# Altium schematic symbol library IC_ADI.SCHLIB: 3169 symbols (part 58 of 181)
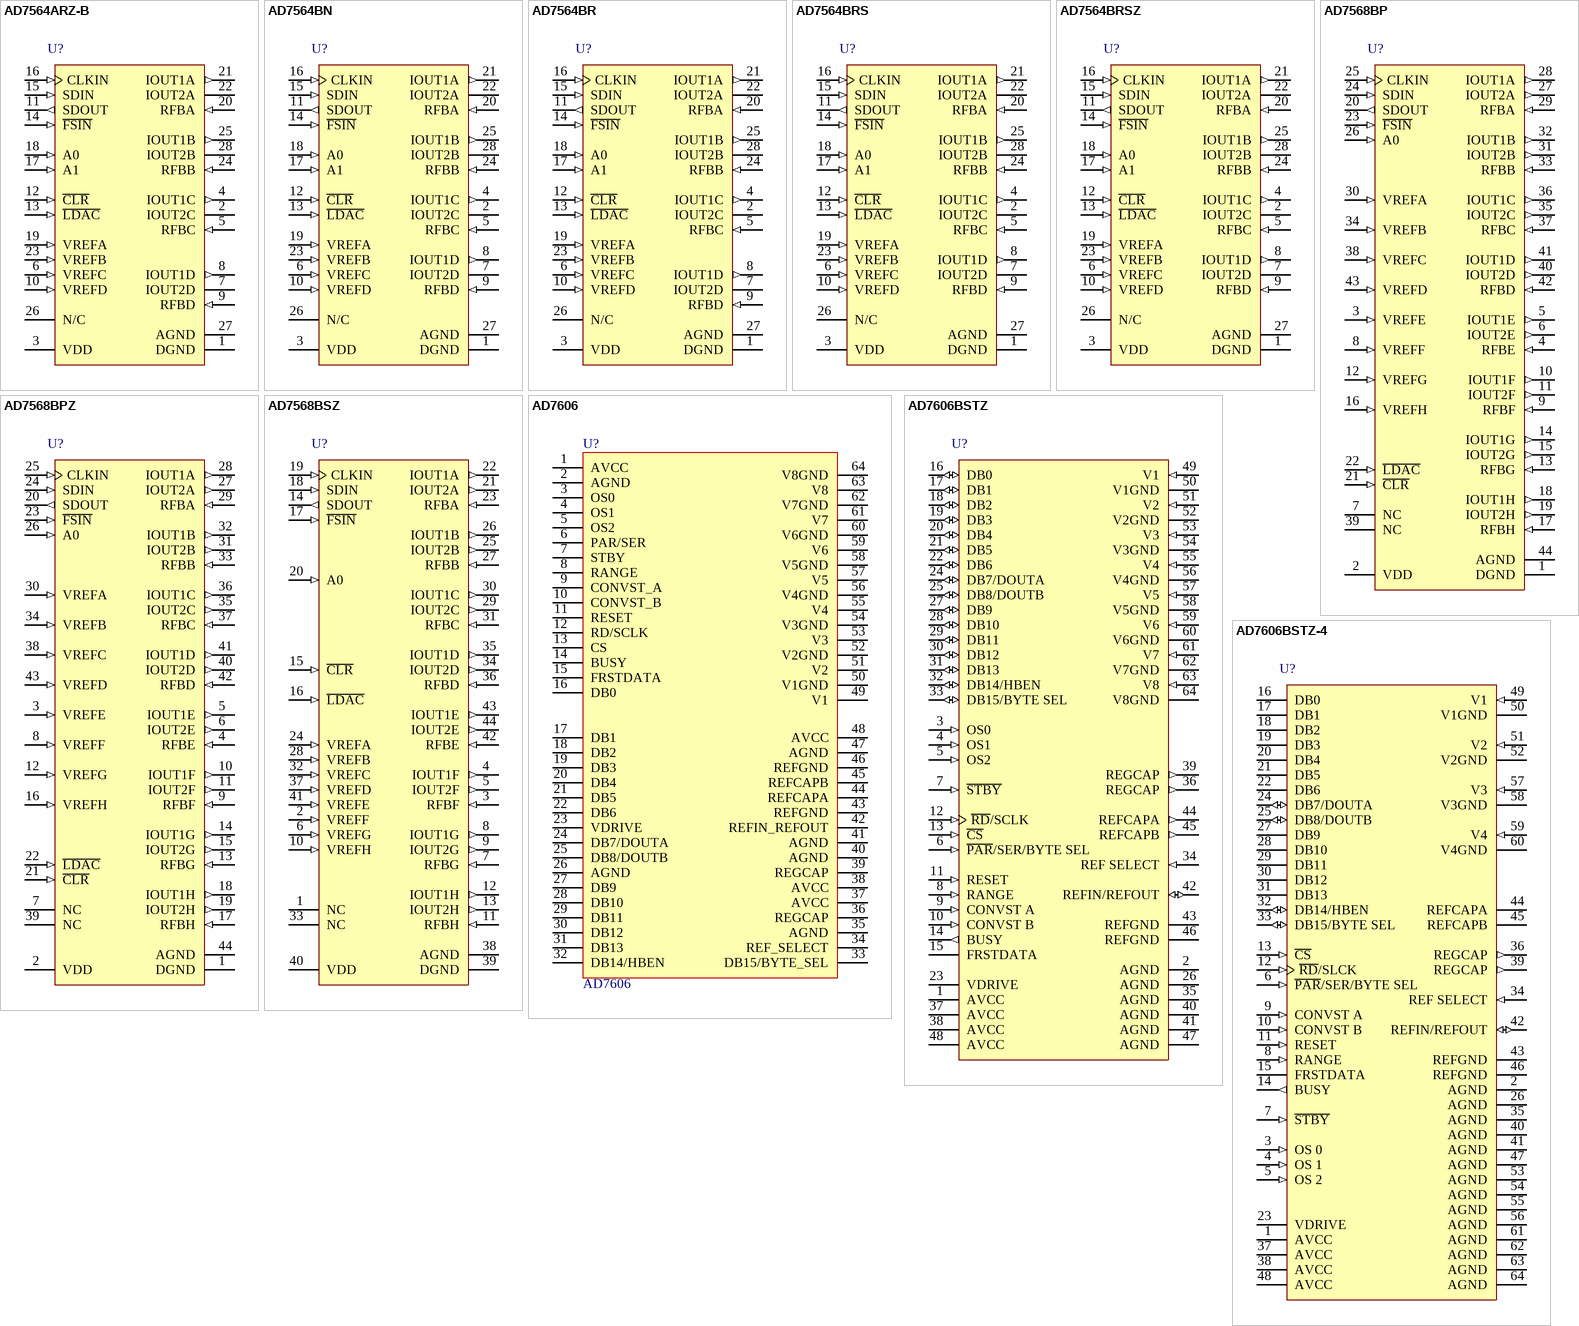
[diagram p248: symbols AD7564ARZ-B to AD7606BSTZ-4]

## AD7568BP
designator U?
Octal 12-Bit LC2MOS Digital-to-Analog Converter, -40 to +85 degC, P-44A, Tube; Generic Part Number: AD7568; PartNumber: AD7568BP; # DAC Outputs: 8; Max V+: 5.25V; Op Pwr Diss: 17.5mW; Resolution (Bits): 12; Settling Time: 500ns; Single Supply: Yes; DatasheetVersion: Rev.C; PackageVersion: 2003; PackageReference: P-44A; PackageDescription: 44-Lead Plastic Leaded Chip Carrier [PLCC]; Supplier Part Number 1: AD7568BP-ND; Supplier Part Number 2: 584-AD7568BP; Packing: Tube; RoHS: N; Mounting Technology: Surface Mount; Code_JEDEC: MO-047-AC; Code_IPC: PLCC-44; ComponentLink1Description: Manufacturer URL; ComponentLink2Description: Datasheet; ComponentLink3Description: Package Specification; ComponentLink4Description: Product URL
footprint PLCC-44N (Footprint not found)
pins: 1 DGND (power) "Digital Ground.", 2 VDD (power) "Positive Power Supply. This is 5 V +/- 5%.", 3 VREFE (in) "DAC Reference Input.", 4 RFBE (in) "DAC Feedback Resistor Pin.", 5 IOUT1E (out) "DAC Current Output Terminal.", 6 IOUT2E (out) "DAC Current Output Terminal.", 7 NC "No Connect.", 8 VREFF (in) "DAC Reference Input.", 9 RFBF (in) "DAC Feedback Resistor Pin.", 10 IOUT1F (out) "DAC Current Output Terminal.", 11 IOUT2F (out) "DAC Current Output Terminal.", 12 VREFG (in) "DAC Reference Input.", 13 RFBG (in) "DAC Feedback Resistor Pin.", 14 IOUT1G (out) "DAC Current Output Terminal.", 15 IOUT2G (out) "DAC Current Output Terminal.", 16 VREFH (in) "DAC Reference Input.", 17 RFBH (in) "DAC Feedback Resistor Pin.", 18 IOUT1H (out) "DAC Current Output Terminal.", 19 IOUT2H (out) "DAC Current Output Terminal.", 20 SDOUT (out) "This shift register output allows multiple devices to be connected in a daisy-chain configuration.", 21 ~{CLR} (in) "Asynchronous C\L\R\ Input. When this input is taken low, all DAC latch outputs go to zero.", 22 ~{LDAC} (in) "Asynchronous L\D\A\C\ Input. When this input is taken low, all DAC latches are simultaneously updated with the contents of the input latches.", 23 ~{FSIN} (in) "Level-Triggered Control Input (Active Low). This is the frame synchronization signal for the input data. When F\S\I\N\ goes low, it enables the input shift register, and data is transferred on the falling edges of CLKIN. If (See Datasheet)", 24 SDIN (in) "Serial Data Input. The device accepts a 16-bit word. The first bit (DB15) is the DAC MSB, with the remaining bits following. Next comes the device address bit, A0. If this does not correspond to the logic level on Pin A0, (See Datasheet)", 25 CLKIN (in) "Clock Input. Data is clocked into the input shift register on the falling edges of CLKIN. Add a pull-down resistor on the clock line to avoid timing issues.", 26 A0 (in) "Device Address Pin. This input gives the device an address. If DB3 of the serial input stream does not correspond to this, the data that follows is ignored and not loaded to any input latch. However, it will appear at SDOUT (See Datasheet)", 27 IOUT2A (out) "DAC Current Output Terminal.", 28 IOUT1A (out) "DAC Current Output Terminal.", 29 RFBA (in) "DAC Feedback Resistor Pin.", 30 VREFA (in) "DAC Reference Input.", 31 IOUT2B (out) "DAC Current Output Terminal.", 32 IOUT1B (out) "DAC Current Output Terminal.", 33 RFBB (in) "DAC Feedback Resistor Pin.", 34 VREFB (in) "DAC Reference Input.", 35 IOUT2C (out) "DAC Current Output Terminal.", 36 IOUT1C (out) "DAC Current Output Terminal.", 37 RFBC (in) "DAC Feedback Resistor Pin.", 38 VREFC (in) "DAC Reference Input.", 39 NC "No Connect.", 40 IOUT2D (out) "DAC Current Output Terminal.", 41 IOUT1D (out) "DAC Current Output Terminal.", 42 RFBD (in) "DAC Feedback Resistor Pin.", 43 VREFD (in) "DAC Reference Input.", 44 AGND (power) "Analog Ground."

## AD7568BPZ
designator U?
Octal 12-Bit LC2MOS Digital-to-Analog Converter, -40 to +85 degC, P-44A, Pb-Free, Tube; Generic Part Number: AD7568; PartNumber: AD7568BPZ; # DAC Outputs: 8; Max V+: 5.25V; Op Pwr Diss: 17.5mW; Resolution (Bits): 12; Settling Time: 500ns; Single Supply: Yes; DatasheetVersion: Rev.C; PackageVersion: 2003; PackageReference: P-44A; PackageDescription: 44-Lead Plastic Leaded Chip Carrier [PLCC]; Supplier Part Number 1: AD7568BPZ-ND; Supplier Part Number 2: 59K5054; Supplier Part Number 3: 584-AD7568BPZ; Packing: Tube; RoHS: Y; Mounting Technology: Surface Mount; Code_JEDEC: MO-047-AC; Code_IPC: PLCC-44; ComponentLink1Description: Manufacturer URL; ComponentLink2Description: Datasheet; ComponentLink3Description: Package Specification; ComponentLink4Description: Product URL
footprint PLCC-44N (Footprint not found)
pins: 1 DGND (power) "Digital Ground.", 2 VDD (power) "Positive Power Supply. This is 5 V +/- 5%.", 3 VREFE (in) "DAC Reference Input.", 4 RFBE (in) "DAC Feedback Resistor Pin.", 5 IOUT1E (out) "DAC Current Output Terminal.", 6 IOUT2E (out) "DAC Current Output Terminal.", 7 NC "No Connect.", 8 VREFF (in) "DAC Reference Input.", 9 RFBF (in) "DAC Feedback Resistor Pin.", 10 IOUT1F (out) "DAC Current Output Terminal.", 11 IOUT2F (out) "DAC Current Output Terminal.", 12 VREFG (in) "DAC Reference Input.", 13 RFBG (in) "DAC Feedback Resistor Pin.", 14 IOUT1G (out) "DAC Current Output Terminal.", 15 IOUT2G (out) "DAC Current Output Terminal.", 16 VREFH (in) "DAC Reference Input.", 17 RFBH (in) "DAC Feedback Resistor Pin.", 18 IOUT1H (out) "DAC Current Output Terminal.", 19 IOUT2H (out) "DAC Current Output Terminal.", 20 SDOUT (out) "This shift register output allows multiple devices to be connected in a daisy-chain configuration.", 21 ~{CLR} (in) "Asynchronous C\L\R\ Input. When this input is taken low, all DAC latch outputs go to zero.", 22 ~{LDAC} (in) "Asynchronous L\D\A\C\ Input. When this input is taken low, all DAC latches are simultaneously updated with the contents of the input latches.", 23 ~{FSIN} (in) "Level-Triggered Control Input (Active Low). This is the frame synchronization signal for the input data. When F\S\I\N\ goes low, it enables the input shift register, and data is transferred on the falling edges of CLKIN. If (See Datasheet)", 24 SDIN (in) "Serial Data Input. The device accepts a 16-bit word. The first bit (DB15) is the DAC MSB, with the remaining bits following. Next comes the device address bit, A0. If this does not correspond to the logic level on Pin A0, (See Datasheet)", 25 CLKIN (in) "Clock Input. Data is clocked into the input shift register on the falling edges of CLKIN. Add a pull-down resistor on the clock line to avoid timing issues.", 26 A0 (in) "Device Address Pin. This input gives the device an address. If DB3 of the serial input stream does not correspond to this, the data that follows is ignored and not loaded to any input latch. However, it will appear at SDOUT (See Datasheet)", 27 IOUT2A (out) "DAC Current Output Terminal.", 28 IOUT1A (out) "DAC Current Output Terminal.", 29 RFBA (in) "DAC Feedback Resistor Pin.", 30 VREFA (in) "DAC Reference Input.", 31 IOUT2B (out) "DAC Current Output Terminal.", 32 IOUT1B (out) "DAC Current Output Terminal.", 33 RFBB (in) "DAC Feedback Resistor Pin.", 34 VREFB (in) "DAC Reference Input.", 35 IOUT2C (out) "DAC Current Output Terminal.", 36 IOUT1C (out) "DAC Current Output Terminal.", 37 RFBC (in) "DAC Feedback Resistor Pin.", 38 VREFC (in) "DAC Reference Input.", 39 NC "No Connect.", 40 IOUT2D (out) "DAC Current Output Terminal.", 41 IOUT1D (out) "DAC Current Output Terminal.", 42 RFBD (in) "DAC Feedback Resistor Pin.", 43 VREFD (in) "DAC Reference Input.", 44 AGND (power) "Analog Ground."

## AD7568BSZ
designator U?
Octal 12-Bit LC2MOS Digital-to-Analog Converter, 0 to +70 degC, S-44-2, Pb-Free, Tray; Generic Part Number: AD7568; PartNumber: AD7568BSZ; # DAC Outputs: 8; Max V+: 5.25V; Op Pwr Diss: 17.5mW; Resolution (Bits): 12; Settling Time: 500ns; Single Supply: Yes; DatasheetVersion: Rev.C; PackageVersion: 041807-A; PackageReference: S-44-2; PackageDescription: 44-Lead Metric Quad Flat Package [MQFP]; Supplier Part Number 1: AD7568BSZ-ND; Supplier Part Number 2: 1311330; Supplier Part Number 3: 59K5056; Supplier Part Number 4: 584-AD7568BSZ; Packing: Tray; RoHS: Y; Mounting Technology: Surface Mount; Code_JEDEC: MO-122-AA-1; ComponentLink1Description: Manufacturer URL; ComponentLink2Description: Datasheet; ComponentLink3Description: Package Specification; ComponentLink4Description: Product URL
footprint LQFP44_0.8mm (Footprint not found)
pins: 1 NC "No connection", 2 VREFF (in) "DAC Reference Input", 3 RFBF (in) "DAC Feedback Resistor Pin", 4 IOUT1F (out) "DAC Current Output Terminal", 5 IOUT2F (out) "DAC Current Output Terminal", 6 VREFG (in) "DAC Reference Input", 7 RFBG (in) "DAC Feedback Resistor Pin", 8 IOUT1G (out) "DAC Current Output Terminal", 9 IOUT2G (out) "DAC Current Output Terminal", 10 VREFH (in) "DAC Reference Input", 11 RFBH (in) "DAC Feedback Resistor Pin", 12 IOUT1H (out) "DAC Current Output Terminal", 13 IOUT2H (out) "DAC Current Output Terminal", 14 SDOUT (out) "This shift register output allows multiple devices to be connected in a daisy-chain configuration.", 15 ~{CLR} (in) "Asynchronous C\L\R\ Input. When this input is taken low, all DAC latch outputs go to zero.", 16 ~{LDAC} (in) "Asynchronous L\D\A\C\ Input. When this input is taken low, all DAC latches are simultaneously updated with the contents of the input latches.", 17 ~{FSIN} (in) "Level-Triggered Control Input (Active Low). This is the frame synchronization signal for the input data. When F\S\I\N\ goes low, it enables the input shift register, and data is transferred on the falling edges of CLKIN. If (See Datasheet)", 18 SDIN (in) "Serial Data Input. The device accepts a 16-bit word. The first bit (DB15) is the DAC MSB, with the remaining bits following. Next comes the device address bit, A0. If this does not correspond to the logic level on Pin A0, (See Datasheet)", 19 CLKIN (in) "Clock Input. Data is clocked into the input shift register on the falling edges of CLKIN. Add a pull-down resistor on the clock line to avoid timing issues.", 20 A0 (in) "Device Address Pin. This input gives the device an address. If DB3 of the serial input stream does not correspond to this, the data that follows is ignored and not loaded to any input latch. However, it will appear at SDOUT (See Datasheet)", 21 IOUT2A (out) "DAC Current Output Terminal", 22 IOUT1A (out) "DAC Current Output Terminal", 23 RFBA (in) "DAC Feedback Resistor Pin", 24 VREFA (in) "DAC Reference Input", 25 IOUT2B (out) "DAC Current Output Terminal", 26 IOUT1B (out) "DAC Current Output Terminal", 27 RFBB (in) "DAC Feedback Resistor Pin", 28 VREFB (in) "DAC Reference Input", 29 IOUT2C (out) "DAC Current Output Terminal", 30 IOUT1C (out) "DAC Current Output Terminal", 31 RFBC (in) "DAC Feedback Resistor Pin", 32 VREFC (in) "DAC Reference Input", 33 NC "No connection", 34 IOUT2D (out) "DAC Current Output Terminal", 35 IOUT1D (out) "DAC Current Output Terminal", 36 RFBD (in) "DAC Feedback Resistor Pin", 37 VREFD (in) "DAC Reference Input", 38 AGND (power) "This pin connects to the back gates of the current steering switches. It should be connected to the signal ground of the system.", 39 DGND (power) "Digital Ground.", 40 VDD (power) "Positive Power Supply. This is 5 V +/- 5%.", 41 VREFE (in) "DAC Reference Input", 42 RFBE (in) "DAC Feedback Resistor Pin", 43 IOUT1E (out) "DAC Current Output Terminal", 44 IOUT2E (out) "DAC Current Output Terminal"

## AD7606
designator U?
footprint LQFP64_0.5MM
pins: 1 AVCC, 2 AGND, 3 OS0, 4 OS1, 5 OS2, 6 PAR/SER, 7 STBY, 8 RANGE, 9 CONVST_A, 10 CONVST_B, 11 RESET, 12 RD/SCLK, 13 CS, 14 BUSY, 15 FRSTDATA, 16 DB0, 17 DB1, 18 DB2, 19 DB3, 20 DB4, 21 DB5, 22 DB6, 23 VDRIVE, 24 DB7/DOUTA, 25 DB8/DOUTB, 26 AGND, 27 DB9, 28 DB10, 29 DB11, 30 DB12, 31 DB13, 32 DB14/HBEN, 33 DB15/BYTE_SEL, 34 REF_SELECT, 35 AGND, 36 REGCAP, 37 AVCC, 38 AVCC, 39 REGCAP, 40 AGND, 41 AGND, 42 REFIN_REFOUT, 43 REFGND, 44 REFCAPA, 45 REFCAPB, 46 REFGND, 47 AGND, 48 AVCC, 49 V1, 50 V1GND, 51 V2, 52 V2GND, 53 V3, 54 V3GND, 55 V4, 56 V4GND, 57 V5, 58 V5GND, 59 V6, 60 V6GND, 61 V7, 62 V7GND, 63 V8, 64 V8GND

## AD7606BSTZ
designator U?
8 Channel Data Acquisition System with 16-Bit, Bipolar Input, Simultaneous Sampling Analog-to-Digital Converter with Parallel, Serial and SPI Interface, 200KSPS, -40 to +85 degC, ST-64-2, Pb-Free, Tray; Generic Part Number: AD7606; PartNumber: AD7606BSTZ; Resolution (Bits): 16; Channels: 8; Throughput Rate (SPS): 200K; Interface: Par, Ser, SPI; DatasheetVersion: Rev.C; PackageVersion: 051706-A; PackageReference: ST-64-2; PackageDescription: 64-Lead Low Profile Quad Flat Package [LQFP]; Supplier Part Number 1: AD7606BSTZ-ND; Supplier Part Number 2: 1864685; Supplier Part Number 3: 76R7614; Supplier Part Number 4: 584-AD7606BSTZ; RoHS: Y; Packing: Tray; Mounting Technology: Surface Mount; Code_JEDEC: MS-026-BCD; ComponentLink1Description: Manufacturer URL; ComponentLink2Description: Datasheet; ComponentLink3Description: Package Specification; ComponentLink4Description: Product URL
footprint LQFP64_0.5MM (Footprint not found)
pins: 1 AVCC (power) "Analog Supply Voltage, 4.75 V to 5.25 V. This supply voltage is applied to the internal front-end amplifiers and to the ADC core. These supply pins should be decoupled to AGND.", 2 AGND (power) "Analog Ground. These pins are the ground reference points for all analog circuitry on the AD7606. All analog input signals and external reference signals should be referred to these pins. All six of these AGND pins should (See Datasheet)", 3 OS0 (in) "Oversampling Mode Pins. Logic inputs. These inputs are used to select the oversampling ratio. OS 2 is the MSB control bit, and OS 0 is the LSB control bit. See the Digital Filter section for more details about the (See Datasheet)", 4 OS1 (in) "Oversampling Mode Pins. Logic inputs. These inputs are used to select the oversampling ratio. OS 2 is the MSB control bit, and OS 0 is the LSB control bit. See the Digital Filter section for more details about the (See Datasheet)", 5 OS2 (in) "Oversampling Mode Pins. Logic inputs. These inputs are used to select the oversampling ratio. OS 2 is the MSB control bit, and OS 0 is the LSB control bit. See the Digital Filter section for more details about the (See Datasheet)", 6 ~{PAR}/SER/BYTE SEL (in) "Parallel/Serial/Byte Interface Selection Input. Logic input. If this pin is tied to a logic low, the parallel interface is selected. If this pin is tied to a logic high,the serial interface is selected. Parallel byte (See Datasheet)", 7 ~{STBY} (in) "Standby Mode Input. This pin is used to place the AD7606/AD7606-6/AD7606-4 into one of two power-down modes: standby mode or shutdown mode. The power-down mode entered depends on the state of the RANGE pin, as shown in Table (See Datasheet)", 8 RANGE (in) "Analog Input Range Selection. Logic input. The polarity on this pin deter-mines the input range of the analog input channels. If this pin is tied to a logic high, the analog input range is +/-10 V for all channels. If this (See Datasheet)", 9 CONVST A (in) "Conversion Start Input A. Logic inputs. These logic inputs are used to initiate conversions on the analog input channels. For simultaneous sampling of all input channels, CONVST A and CONVST B can be shorted together, and a (See Datasheet)", 10 CONVST B (in) "Conversion Start Input B. Logic inputs. These logic inputs are used to initiate conversions on the analog input channels. For simultaneous sampling of all input channels, CONVST A and CONVST B can be shorted together, and a (See Datasheet)", 11 RESET (in) "Reset Input. When set to logic high, the rising edge of RESET resets the AD7606/AD7606-6/AD7606-4. The part should receive a RESET pulse after power-up. The RESET high pulse should typically be 50 ns wide. If a RESET pulse (See Datasheet)", 12 ~{RD}/SCLK (in) "Parallel Data Read Control Input When the Parallel Interface Is Selected (R\D\)/ Serial Clock Input When the Serial Interface Is Selected (SCLK). When both C\S\ and R\D\ are logic low in parallel mode, the output bus is (See Datasheet)", 13 ~{CS} (in) "Chip Select. This active low logic input frames the data transfer. When both C\S\ and R\D\ are logic low in parallel mode, the DB[15:0] output bus is enabled and the conversion result is output on the parallel data bus lines.(See Datasheet)", 14 BUSY (out) "Busy Output. This pin transitions to a logic high after both CONVST A and CONVST B rising edges and indicates that the conversion process has started. The BUSY output remains high until the conversion process for all (See Datasheet)", 15 FRSTDATA (hiz) "Digital Output. The FRSTDATA output signal indicates when the first channel, V1, is being read back on the parallel, byte, or serial interface. When the C\S\ input is high, the FRSTDATA output pin is in three-state. The (See Datasheet)", 16 DB0 (io) "Parallel Output Data Bit, DB6 to DB0. When P\A\R\/SER/BYTE SEL = 0, this pin acts as three-state parallel digital input/output pin. When C\S\ and R\D\ are low, these pins are used to output DB6 to DB0 of the conversion (See Datasheet)", 17 DB1 (io) "Parallel Output Data Bit, DB6 to DB0. When P\A\R\/SER/BYTE SEL = 0, this pin acts as three-state parallel digital input/output pin. When C\S\ and R\D\ are low, these pins are used to output DB6 to DB0 of the conversion (See Datasheet)", 18 DB2 (io) "Parallel Output Data Bit, DB6 to DB0. When P\A\R\/SER/BYTE SEL = 0, this pin acts as three-state parallel digital input/output pin. When C\S\ and R\D\ are low, these pins are used to output DB6 to DB0 of the conversion (See Datasheet)", 19 DB3 (io) "Parallel Output Data Bit, DB6 to DB0. When P\A\R\/SER/BYTE SEL = 0, this pin acts as three-state parallel digital input/output pin. When C\S\ and R\D\ are low, these pins are used to output DB6 to DB0 of the conversion (See Datasheet)", 20 DB4 (io) "Parallel Output Data Bit, DB6 to DB0. When P\A\R\/SER/BYTE SEL = 0, this pin acts as three-state parallel digital input/output pin. When C\S\ and R\D\ are low, these pins are used to output DB6 to DB0 of the conversion (See Datasheet)", 21 DB5 (io) "Parallel Output Data Bit, DB6 to DB0. When P\A\R\/SER/BYTE SEL = 0, this pin acts as three-state parallel digital input/output pin. When C\S\ and R\D\ are low, these pins are used to output DB6 to DB0 of the conversion (See Datasheet)", 22 DB6 (io) "Parallel Output Data Bit, DB6 to DB0. When P\A\R\/SER/BYTE SEL = 0, this pin acts as three-state parallel digital input/output pin. When C\S\ and R\D\ are low, these pins are used to output DB6 to DB0 of the conversion (See Datasheet)", 23 VDRIVE (power) "Logic Power Supply Input. The voltage (2.3 V to 5.25 V) supplied at this pin determines the operating voltage of the interface. This pin is nominally at the same supply as the supply of the host interface (that is, DSP and (See Datasheet)", 24 DB7/DOUTA (io) "Parallel Output Data Bit 7 (DB7)/Serial Interface Data Output Pin (DoutA). When P\A\R\/SER/BYTE SEL = 0, this pin acts as a three-state parallel digital input/output pin. When C\S\ and R\D\ are low, this pin is used to (See Datasheet)", 25 DB8/DOUTB (io) "Parallel Output Data Bit 8 (DB8)/Serial Interface Data Output Pin (DoutB).  When P\A\R\/SER/BYTE SEL = 0, this pin acts as a three-state parallel digital input/output pin. When C\S\ and R\D\ are low, this pin is used to (See Datasheet)", 26 AGND (power) "Analog Ground. These pins are the ground reference points for all analog circuitry on the AD7606. All analog input signals and external reference signals should be referred to these pins. All six of these AGND pins should (See Datasheet)", 27 DB9 (io) "Parallel Output Data Bit, DB13 to DB9. When P\A\R\/SER/BYTE SEL = 0, this pin acts as three-state parallel digital input/output pin. When C\S\ and R\D\ are low, these pins are used to output DB13 to DB9 of the conversion (See Datasheet)", 28 DB10 (io) "Parallel Output Data Bit, DB13 to DB9. When P\A\R\/SER/BYTE SEL = 0, this pin acts as three-state parallel digital input/output pin. When C\S\ and R\D\ are low, these pins are used to output DB13 to DB9 of the conversion (See Datasheet)", 29 DB11 (io) "Parallel Output Data Bit, DB13 to DB9. When P\A\R\/SER/BYTE SEL = 0, this pin acts as three-state parallel digital input/output pin. When C\S\ and R\D\ are low, these pins are used to output DB13 to DB9 of the conversion (See Datasheet)", 30 DB12 (io) "Parallel Output Data Bit, DB13 to DB9. When P\A\R\/SER/BYTE SEL = 0, this pin acts as three-state parallel digital input/output pin. When C\S\ and R\D\ are low, these pins are used to output DB13 to DB9 of the conversion (See Datasheet)", 31 DB13 (io) "Parallel Output Data Bit, DB13 to DB9. When P\A\R\/SER/BYTE SEL = 0, this pin acts as three-state parallel digital input/output pin. When C\S\ and R\D\ are low, these pins are used to output DB13 to DB9 of the conversion (See Datasheet)", 32 DB14/HBEN (io) "Parallel Output Data Bit 14 (DB14)/High Byte Enable (HBEN). When P\A\R\/ SER/BYTE SEL = 0, this pin acts as a three-state parallel digital output pin. When C\S\ and R\D\ are low, this pin is used to output DB14 of the (See Datasheet)", 33 DB15/BYTE SEL (io) "Parallel Output Data Bit 15 (DB15)/Parallel Byte Mode Select (BYTE SEL).  When P\A\R\/SER/BYTE SEL = 0, this pin acts as a three-state parallel digital output pin. When C\S\ and R\D\ are low, this pin is used to output DB15 (See Datasheet)", 34 REF SELECT (in) "Internal/External Reference Selection Input. Logic input. If this pin is set to logic high, the internal reference is selected and enabled. If this pin is set to logic low, the internal reference is disabled and an external (See Datasheet)", 35 AGND (power) "Analog Ground. These pins are the ground reference points for all analog circuitry on the AD7606. All analog input signals and external reference signals should be referred to these pins. All six of these AGND pins should (See Datasheet)", 36 REGCAP (out) "Decoupling Capacitor Pin for Voltage Output from Internal Regulator.  These output pins should be decoupled separately to AGND using a 1 uF capacitor. The voltage on these pins is in the range of 2.5 V to 2.7 V.", 37 AVCC (power) "Analog Supply Voltage, 4.75 V to 5.25 V. This supply voltage is applied to the internal front-end amplifiers and to the ADC core. These supply pins should be decoupled to AGND.", 38 AVCC (power) "Analog Supply Voltage, 4.75 V to 5.25 V. This supply voltage is applied to the internal front-end amplifiers and to the ADC core. These supply pins should be decoupled to AGND.", 39 REGCAP (out) "Decoupling Capacitor Pin for Voltage Output from Internal Regulator.  These output pins should be decoupled separately to AGND using a 1 uF capacitor. The voltage on these pins is in the range of 2.5 V to 2.7 V.", 40 AGND (power) "Analog Ground. These pins are the ground reference points for all analog circuitry on the AD7606. All analog input signals and external reference signals should be referred to these pins. All six of these AGND pins should (See Datasheet)", 41 AGND (power) "Analog Ground. These pins are the ground reference points for all analog circuitry on the AD7606. All analog input signals and external reference signals should be referred to these pins. All six of these AGND pins should (See Datasheet)", 42 REFIN/REFOUT (io) "Reference Input (REFIN)/Reference Output (REFOUT). The on-chip reference of 2.5 V is available on this pin for external use if the REF SELECT pin is set to logic high. Alternatively, the internal reference can be disabled by (See Datasheet)", 43 REFGND (power) "Reference Ground Pins. These pins should be connected to AGND.", 44 REFCAPA (out) "Reference Buffer Output Force/Sense Pins. These pins must be connected together and decoupled to AGND using a low ESR, 10 uF ceramic capacitor. The voltage on these pins is typically 4.5 V.", 45 REFCAPB (out) "Reference Buffer Output Force/Sense Pins. These pins must be connected together and decoupled to AGND using a low ESR, 10 uF ceramic capacitor. The voltage on these pins is typically 4.5 V.", 46 REFGND (power) "Reference Ground Pins. These pins should be connected to AGND.", 47 AGND (power) "Analog Ground. These pins are the ground reference points for all analog circuitry on the AD7606. All analog input signals and external reference signals should be referred to these pins. All six of these AGND pins should (See Datasheet)", 48 AVCC (power) "Analog Supply Voltage, 4.75 V to 5.25 V. This supply voltage is applied to the internal front-end amplifiers and to the ADC core. These supply pins should be decoupled to AGND.", 49 V1 (in) "Analog Input. This pin is a single-ended analog input. The analog input range of this channel is determined by the RANGE pin.", 50 V1GND (power) "Analog Input Ground Pins. These pins correspond to Analog Input Pin V1 and Analog Input Pin V2. All analog input AGND pins should connect to the AGND plane of a system.", 51 V2 (in) "Analog Input. This pin is a single-ended analog input. The analog input range of this channel is determined by the RANGE pin.", 52 V2GND (power) "Analog Input Ground Pins. These pins correspond to Analog Input Pin V1 and Analog Input Pin V2. All analog input AGND pins should connect to the AGND plane of a system.", 53 V3 (in) "Analog Input 3. For the AD7606-4, this is an AGND pin.", 54 V3GND (power) "Analog Input Ground Pin. For the AD7606-4, this is an AGND pin.", 55 V4 (in) "Analog Input 4. For the AD7606-6 and the AD7606-4, this is an AGND pin.", 56 V4GND (power) "Analog Input Ground Pin. For the AD7606-6 and AD7606-4, this is an AGND pin.", 57 V5 (in) "Analog Inputs. These pins are single-ended analog inputs. The analog input range of these channels is determined by the RANGE pin.", 58 V5GND (power) "Analog Input Ground Pins. All analog input AGND pins should connect to the AGND plane of a system.", 59 V6 (in) "Analog Inputs. These pins are single-ended analog inputs.", 60 V6GND (power) "Analog Input Ground Pins. All analog input AGND pins should connect to the AGND plane of a system.", 61 V7 (in) "Analog Input Pins. For the AD7606-4, this is an AGND pin.", 62 V7GND (power) "Analog Input Ground Pins. For the AD7606-4, this is an AGND pin.", 63 V8 (in) "Analog Input Pin. For the AD7606-4 and AD7606-6, this is an AGND pin.", 64 V8GND (power) "Analog Input Ground Pin. For the AD7606-4 and AD7606-6, this is an AGND pin."

## AD7606BSTZ-4
designator U?
Quad Data Acquisition System with 16-Bit, Bipolar Input, Simultaneous Sampling Analog-to-Digital Converter with Parallel, Serial and SPI Interface, 200KSPS, -40 to +85 degC, ST-64-2, Pb-Free, Tray; Generic Part Number: AD7606-4; PartNumber: AD7606BSTZ-4; Resolution (Bits): 16; Channels: 4; Throughput Rate (SPS): 200K; Interface: Par, Ser, SPI; DatasheetVersion: Rev.C; PackageVersion: 051706-A; PackageReference: ST-64-2; PackageDescription: 64-Lead Low Profile Quad Flat Package [LQFP]; Supplier Part Number 1: AD7606BSTZ-4-ND; Supplier Part Number 2: 2295975; Supplier Part Number 3: 76R7616; Supplier Part Number 4: 584-AD7606BSTZ-4; RoHS: Y; Packing: Tray; Mounting Technology: Surface Mount; Code_JEDEC: MS-026-BCD; ComponentLink1Description: Manufacturer URL; ComponentLink2Description: Datasheet; ComponentLink3Description: Package Specification; ComponentLink4Description: Product URL
footprint LQFP64_0.5MM (Footprint not found)
pins: 1 AVCC (power) "Analog Supply Voltage, 4.75 V to 5.25 V. This supply voltage is applied to the internal front-end amplifiers and to the ADC core. These supply pins should be decoupled to AGND.", 2 AGND (power) "Analog Ground. These pins are the ground reference points for all analog circuitry on the AD7606. All analog input signals and external reference signals should be referred to these pins. All six of these AGND pins should (See Datasheet)", 3 OS 0 (in) "Oversampling Mode Pins. Logic inputs. These inputs are used to select the oversampling ratio. OS 2 is the MSB control bit, and OS 0 is the LSB control bit. See the Digital Filter section for more details about the (See Datasheet)", 4 OS 1 (in) "Oversampling Mode Pins. Logic inputs. These inputs are used to select the oversampling ratio. OS 2 is the MSB control bit, and OS 0 is the LSB control bit. See the Digital Filter section for more details about the (See Datasheet)", 5 OS 2 (in) "Oversampling Mode Pins. Logic inputs. These inputs are used to select the oversampling ratio. OS 2 is the MSB control bit, and OS 0 is the LSB control bit. See the Digital Filter section for more details about the (See Datasheet)", 6 ~{PAR}/SER/BYTE SEL (in) "Parallel/Serial/Byte Interface Selection Input. Logic input. If this pin is tied to a logic low, the parallel interface is selected. If this pin is tied to a logic high, the serial interface is selected. Parallel byte (See Datasheet)", 7 ~{STBY} (in) "Standby Mode Input. This pin is used to place the AD7606/AD7606-6/ AD7606-4 into one of two power-down modes: standby mode or shutdown mode. The power-down mode entered depends on the state of the RANGE pin, as shown in (See Datasheet)", 8 RANGE (in) "Analog Input Range Selection. Logic input. The polarity on this pin deter-mines the input range of the analog input channels. If this pin is tied to a logic high, the analog input range is +/-10 V for all channels. If this (See Datasheet)", 9 CONVST A (in) "Conversion Start Input A. Logic inputs. These logic inputs are used to initiate conversions on the analog input channels.For simultaneous sampling of all input channels, CONVST A and CONVST B can be shorted together, and a (See Datasheet)", 10 CONVST B (in) "Conversion Start Input B. Logic inputs. These logic inputs are used to initiate conversions on the analog input channels.For simultaneous sampling of all input channels, CONVST A and CONVST B can be shorted together, and a (See Datasheet)", 11 RESET (in) "Reset Input. When set to logic high, the rising edge of RESET resets the AD7606/AD7606-6/AD7606-4. The part should receive a RESET pulse after power-up. The RESET high pulse should typically be 50 ns wide. If a RESET pulse (See Datasheet)", 12 ~{RD}/SLCK (in) "Parallel Data Read Control Input When the Parallel Interface Is Selected (R\D\)/ Serial Clock Input When the Serial Interface Is Selected (SCLK). When both C\S\ and R\D\ are logic low in parallel mode, the output bus is (See Datasheet)", 13 ~{CS} (in) "Chip Select. This active low logic input frames the data transfer. When both C\S\ and R\D\ are logic low in parallel mode, the DB[15:0] output bus is enabled and the conversion result is output on the parallel data bus lines.(See Datasheet)", 14 BUSY (out) "Busy Output. This pin transitions to a logic high after both CONVST A and CONVST B rising edges and indicates that the conversion process has started. The BUSY output remains high until the conversion process for all (See Datasheet)", 15 FRSTDATA (hiz) "Digital Output. The FRSTDATA output signal indicates when the first channel, V1, is being read back on the parallel, byte, or serial interface. When the C\S\ input is high, the FRSTDATA output pin is in three-state. The (See Datasheet)", 16 DB0 (hiz) "Parallel Output Data Bits DB0. When P\A\R\/SER/BYTE SEL = 0, this pin acts as three-state parallel digital input/output pin. When C\S\ and R\D\ are low, this pin is used to output  DB0 of the conversion result. When (See Datasheet)", 17 DB1 (hiz) "Parallel Output Data Bits DB1. When P\A\R\/SER/BYTE SEL = 0, this pin acts as three-state parallel digital input/output pin. When C\S\ and R\D\ are low, this pin is used to output  DB1 of the conversion result. When (See Datasheet)", 18 DB2 (hiz) "Parallel Output Data Bits DB2. When P\A\R\/SER/BYTE SEL = 0, this pin acts as three-state parallel digital input/output pin. When C\S\ and R\D\ are low, this pin is used to output  DB2 of the conversion result. When (See Datasheet)", 19 DB3 (hiz) "Parallel Output Data Bits DB3. When P\A\R\/SER/BYTE SEL = 0, this pin acts as three-state parallel digital input/output pin. When C\S\ and R\D\ are low, this pin is used to output  DB3 of the conversion result. When (See Datasheet)", 20 DB4 (hiz) "Parallel Output Data Bits DB4. When P\A\R\/SER/BYTE SEL = 0, this pin acts as three-state parallel digital input/output pin. When C\S\ and R\D\ are low, this pin is used to output  DB4 of the conversion result. When (See Datasheet)", 21 DB5 (hiz) "Parallel Output Data Bits DB5. When P\A\R\/SER/BYTE SEL = 0, this pin acts as three-state parallel digital input/output pin. When C\S\ and R\D\ are low, this pin is used to output  DB5 of the conversion result. When (See Datasheet)", 22 DB6 (hiz) "Parallel Output Data Bits DB6. When P\A\R\/SER/BYTE SEL = 0, this pin acts as three-state parallel digital input/output pin. When C\S\ and R\D\ are low, this pin is used to output  DB6 of the conversion result. When (See Datasheet)", 23 VDRIVE (power) "Logic Power Supply Input. The voltage (2.3 V to 5.25 V) supplied at this pin determines the operating voltage of the interface. This pin is nominally at the same supply as the supply of the host interface (that is, DSP and (See Datasheet)", 24 DB7/DOUTA (io) "Parallel Output Data Bit 7 (DB7)/Serial Interface Data Output Pin (DOUTA). When P\A\R\/SER/BYTE SEL = 0, this pins acts as a three-state parallel digital input/output pin. When C\S\ and R\D\ are low, this pin is used to (See Datasheet)", 25 DB8/DOUTB (io) "Parallel Output Data Bit 8 (DB8)/Serial Interface Data Output Pin (DOUTB).When P\A\R\/SER/BYTE SEL = 0, this pin acts as a three-state parallel digital input/output pin. When C\S\ and R\D\ are low, this pin is used to output (See Datasheet)", 26 AGND (power) "Analog Ground. These pins are the ground reference points for all analog circuitry on the AD7606. All analog input signals and external reference signals should be referred to these pins. All six of these AGND pins should (See Datasheet)", 27 DB9 (hiz) "Parallel Output Data DB9. When P\A\R\/SER/BYTE SEL = 0, this pin acts as three-state parallel digital input/output pin. When C\S\ and R\D\ are low, this pin is used to output DB9 of the conversion result. When (See Datasheet)", 28 DB10 (hiz) "Parallel Output Data DB10. When P\A\R\/SER/BYTE SEL = 0, this pin acts as three-state parallel digital input/output pin. When C\S\ and R\D\ are low, this pin is used to output DB10 of the conversion result. When (See Datasheet)", 29 DB11 (hiz) "Parallel Output Data DB11. When P\A\R\/SER/BYTE SEL = 0, this pin acts as three-state parallel digital input/output pin. When C\S\ and R\D\ are low, this pin is used to output DB11 of the conversion result. When (See Datasheet)", 30 DB12 (hiz) "Parallel Output Data DB12. When P\A\R\/SER/BYTE SEL = 0, this pin acts as three-state parallel digital input/output pin. When C\S\ and R\D\ are low, this pin is used to output DB12 of the conversion result. When (See Datasheet)", 31 DB13 (hiz) "Parallel Output Data DB13. When P\A\R\/SER/BYTE SEL = 0, this pin acts as three-state parallel digital input/output pin. When C\S\ and R\D\ are low, this pin is used to output DB13 of the conversion result. When (See Datasheet)", 32 DB14/HBEN (io) "Parallel Output Data Bit 14 (DB14)/High Byte Enable (HBEN). When P\A\R\/ SER/BYTE SEL = 0, this pin acts as a three-state parallel digital output pin. When C\S\ and R\D\ are low, this pin is used to output DB14 of the (See Datasheet)", 33 DB15/BYTE SEL (io) "Parallel Output Data Bit 15 (DB15)/Parallel Byte Mode Select (BYTE SEL). When P\A\R\/SER/BYTE SEL = 0, this pin acts as a three-state parallel digital output pin. When C\S\ and R\D\ are low, this pin is used to output DB15 (See Datasheet)", 34 REF SELECT (in) "Internal/External Reference Selection Input. Logic input. If this pin is set to logic high, the internal reference is selected and enabled. If this pin is set to logic low, the internal reference is disabled and an external (See Datasheet)", 35 AGND (power) "Analog Ground. These pins are the ground reference points for all analog circuitry on the AD7606. All analog input signals and external reference signals should be referred to these pins. All six of these AGND pins should (See Datasheet)", 36 REGCAP (out) "Decoupling Capacitor Pin for Voltage Output from Internal Regulator.These output pins should be decoupled separately to AGND using a 1 uF capacitor. The voltage on these pins is in the range of 2.5 V to 2.7 V.", 37 AVCC (power) "Analog Supply Voltage, 4.75 V to 5.25 V. This supply voltage is applied to the internal front-end amplifiers and to the ADC core. These supply pins should be decoupled to AGND.", 38 AVCC (power) "Analog Supply Voltage, 4.75 V to 5.25 V. This supply voltage is applied to the internal front-end amplifiers and to the ADC core. These supply pins should be decoupled to AGND.", 39 REGCAP (out) "Decoupling Capacitor Pin for Voltage Output from internal Regulator. These output pins should be decoupled separately to AGND using a 1 uF capacitor. The voltage on these pins is in the range of 2.5V to 2.7 V.", 40 AGND (power) "Analog Ground. These pins are the ground reference points for all analog circuitry on the AD7606. All analog input signals and external reference signals should be referred to these pins. All six of these AGND pins should (See Datasheet)", 41 AGND (power) "Analog Ground. These pins are the ground reference points for all analog circuitry on the AD7606. All analog input signals and external reference signals should be referred to these pins. All six of these AGND pins should (See Datasheet)", 42 REFIN/REFOUT (io) "Reference Input (REFIN)/Reference Output (REFOUT). The on-chip reference of 2.5 V is available on this pin for external use if the REF SELECT pin is set to logic high. Alternatively, the internal reference can be disabled by (See Datasheet)", 43 REFGND (power) "Reference Ground Pins. These pins should be connected to AGND.", 44 REFCAPA "Reference Buffer Output Force/Sense Pins. These pins must be connected together and decoupled to AGND using a low ESR, 10 uF ceramic capacitor. The voltage on these pins is typically 4.5 V.", 45 REFCAPB "Reference Buffer Output Force/Sense Pins. These pins must be connected together and decoupled to AGND using a low ESR, 10 uF ceramic capacitor. The voltage on these pins is typically 4.5 V.", 46 REFGND (power) "Reference Ground Pins. These pins should be connected to AGND.", 47 AGND (power) "Analog Ground. These pins are the ground reference points for all analog circuitry on the AD7606. All analog input signals and external reference signals should be referred to these pins. All six of these AGND pins should (See Datasheet)", 48 AVCC (power) "Analog Supply Voltage, 4.75 V to 5.25 V. This supply voltage is applied to the internal front-end amplifiers and to the ADC core. These supply pins should be decoupled to AGND.", 49 V1 (in) "Analog Input. This pin is a single-ended analog input. The analog input range of this channel is determined by the RANGE pin.", 50 V1GND (power) "Analog Input Ground Pins. These pins correspond to Analog Input Pin V1 and Analog Input Pin V2. All analog input AGND pins should connect to the AGND plane of a system.", 51 V2 (in) "Analog Input. This pin is a single-ended analog input. The analog input range of this channel is determined by the RANGE pin.", 52 V2GND (power) "Analog Input Ground Pins. These pins correspond to Analog Input Pin V1 and Analog Input Pin V2. All analog input AGND pins should connect to the AGND plane of a system.", 53 AGND (power) "Analog Input 3. For the AD7606-4, this is an AGND pin.", 54 AGND (power) "Analog Input Ground Pin. For the AD7606-4, this is an AGND pin.", 55 AGND (power) "Analog Input 4. For  the AD7606-4, this is an AGND pin.", 56 AGND (power) "Analog Input Ground Pin. For the  AD7606-4, this is an AGND pin.", 57 V3 (in) "Analog Inputs. These pins are single-ended analog inputs. The analog input range of these channels is determined by the RANGE pin.", 58 V3GND (power) "Analog Input Ground Pins. All analog input AGND pins should connect to the AGND plane of a system.", 59 V4 (in) "Analog Inputs. These pins are single-ended analog inputs.", 60 V4GND (power) "Analog Input Ground Pins. All analog input AGND pins should connect to the AGND plane of a system.", 61 AGND (power) "Analog Input Pins. For the AD7606-4, this is an AGND pin.", 62 AGND (power) "Analog Input Ground Pins. For the AD7606-4, this is an AGND pin.", 63 AGND (power) "Analog Input Pin. For the AD7606-4 , this is an AGND pin.", 64 AGND (power) "Analog Input Ground Pin. For the AD7606-4 , this is an AGND pin."

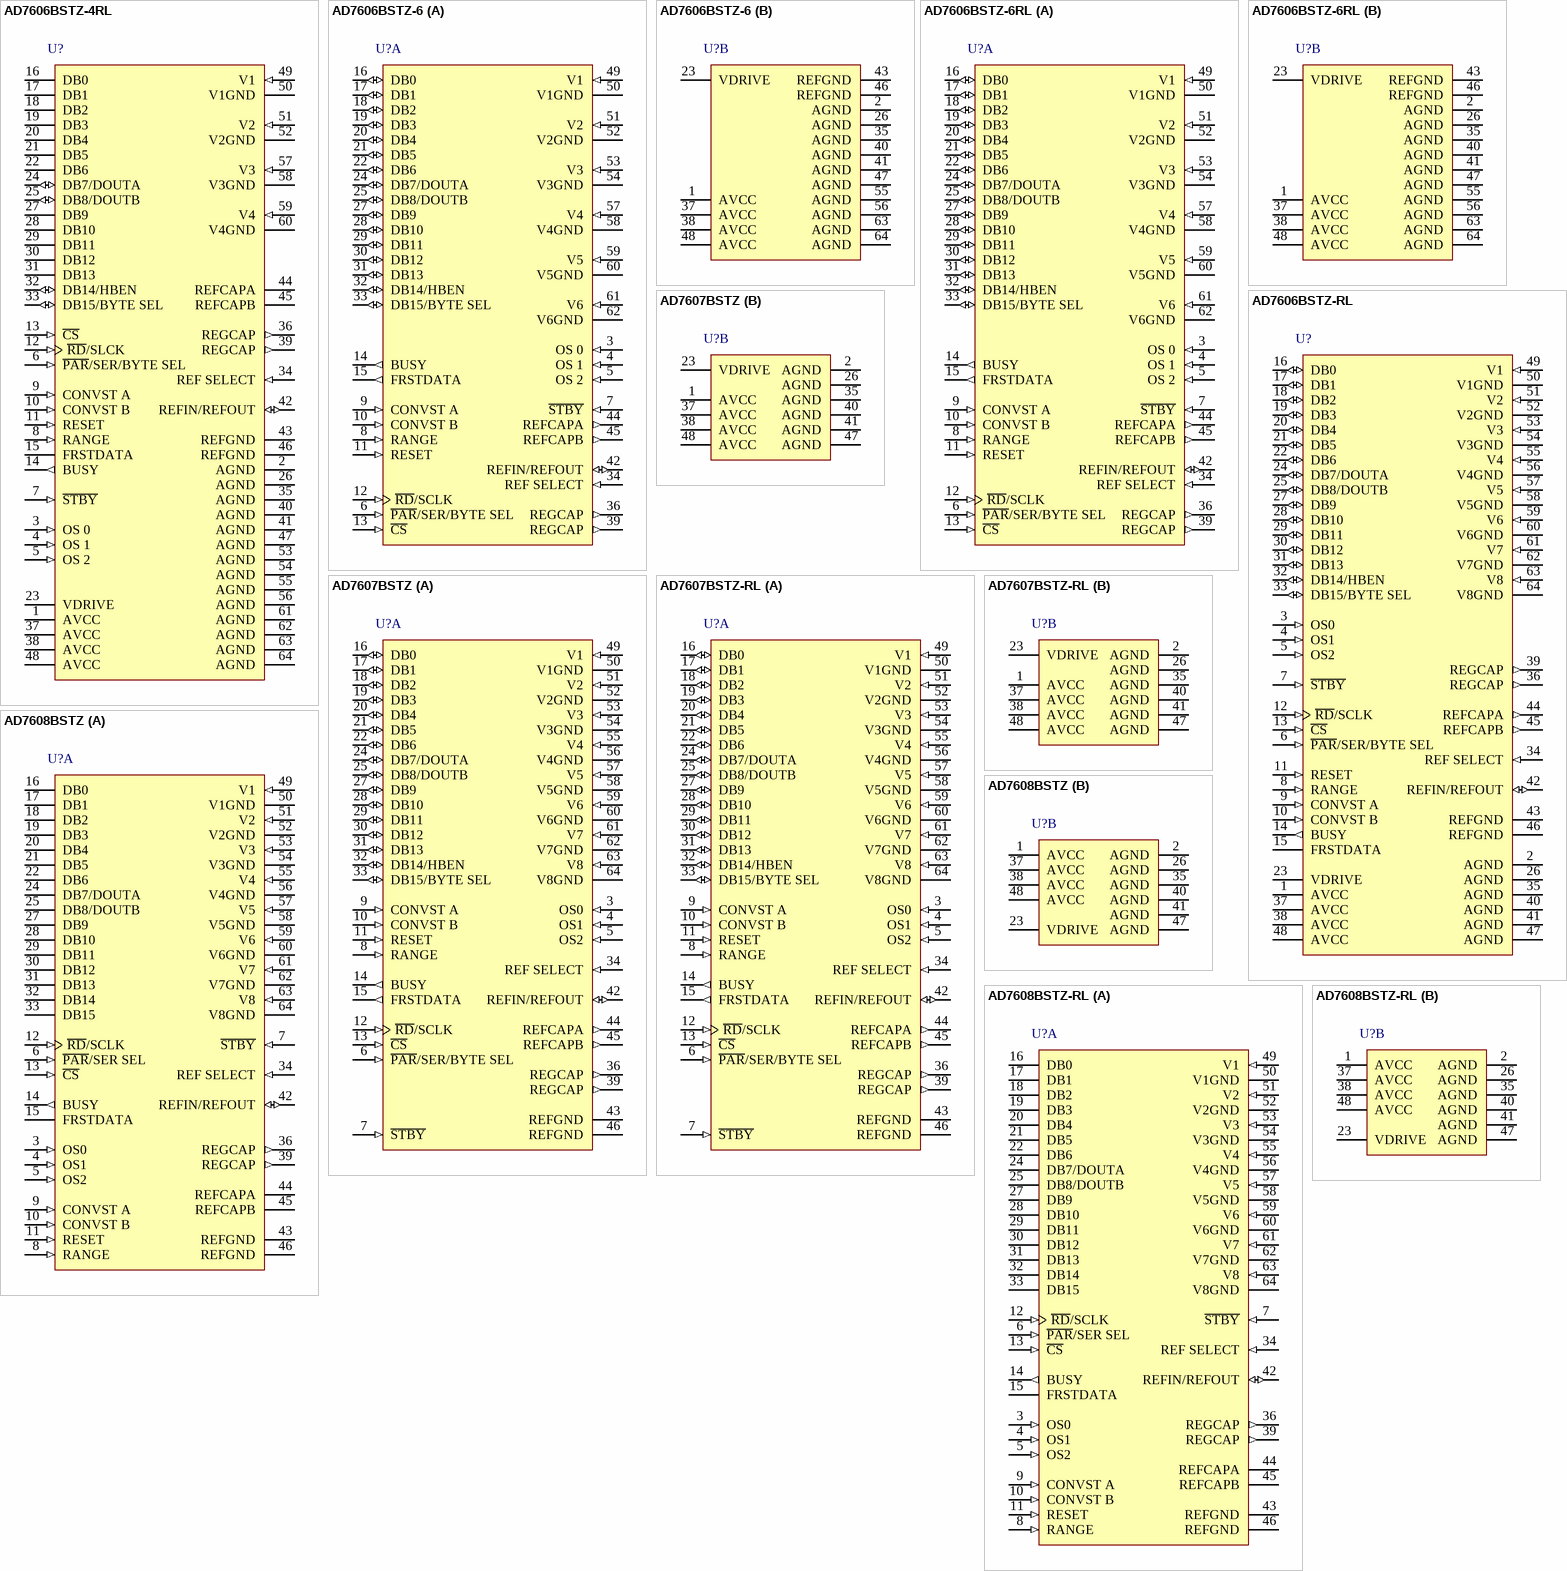
[diagram p50: symbols AD7606BSTZ-4RL to AD7608BSTZ-RL]